# Altium footprint library my Library.PcbLib: 1247 footprints (part 35 of 78)
Each footprint in its own frame and in the unit in brackets; x right, y up, seen from the top. Pads: shape width x height; smd on the part's side, far side on the other; paste and mask are expansions set on the pad; w line width, h text height; cw(c..) or ccw(c..) is an arc to the next point about the centre after c.
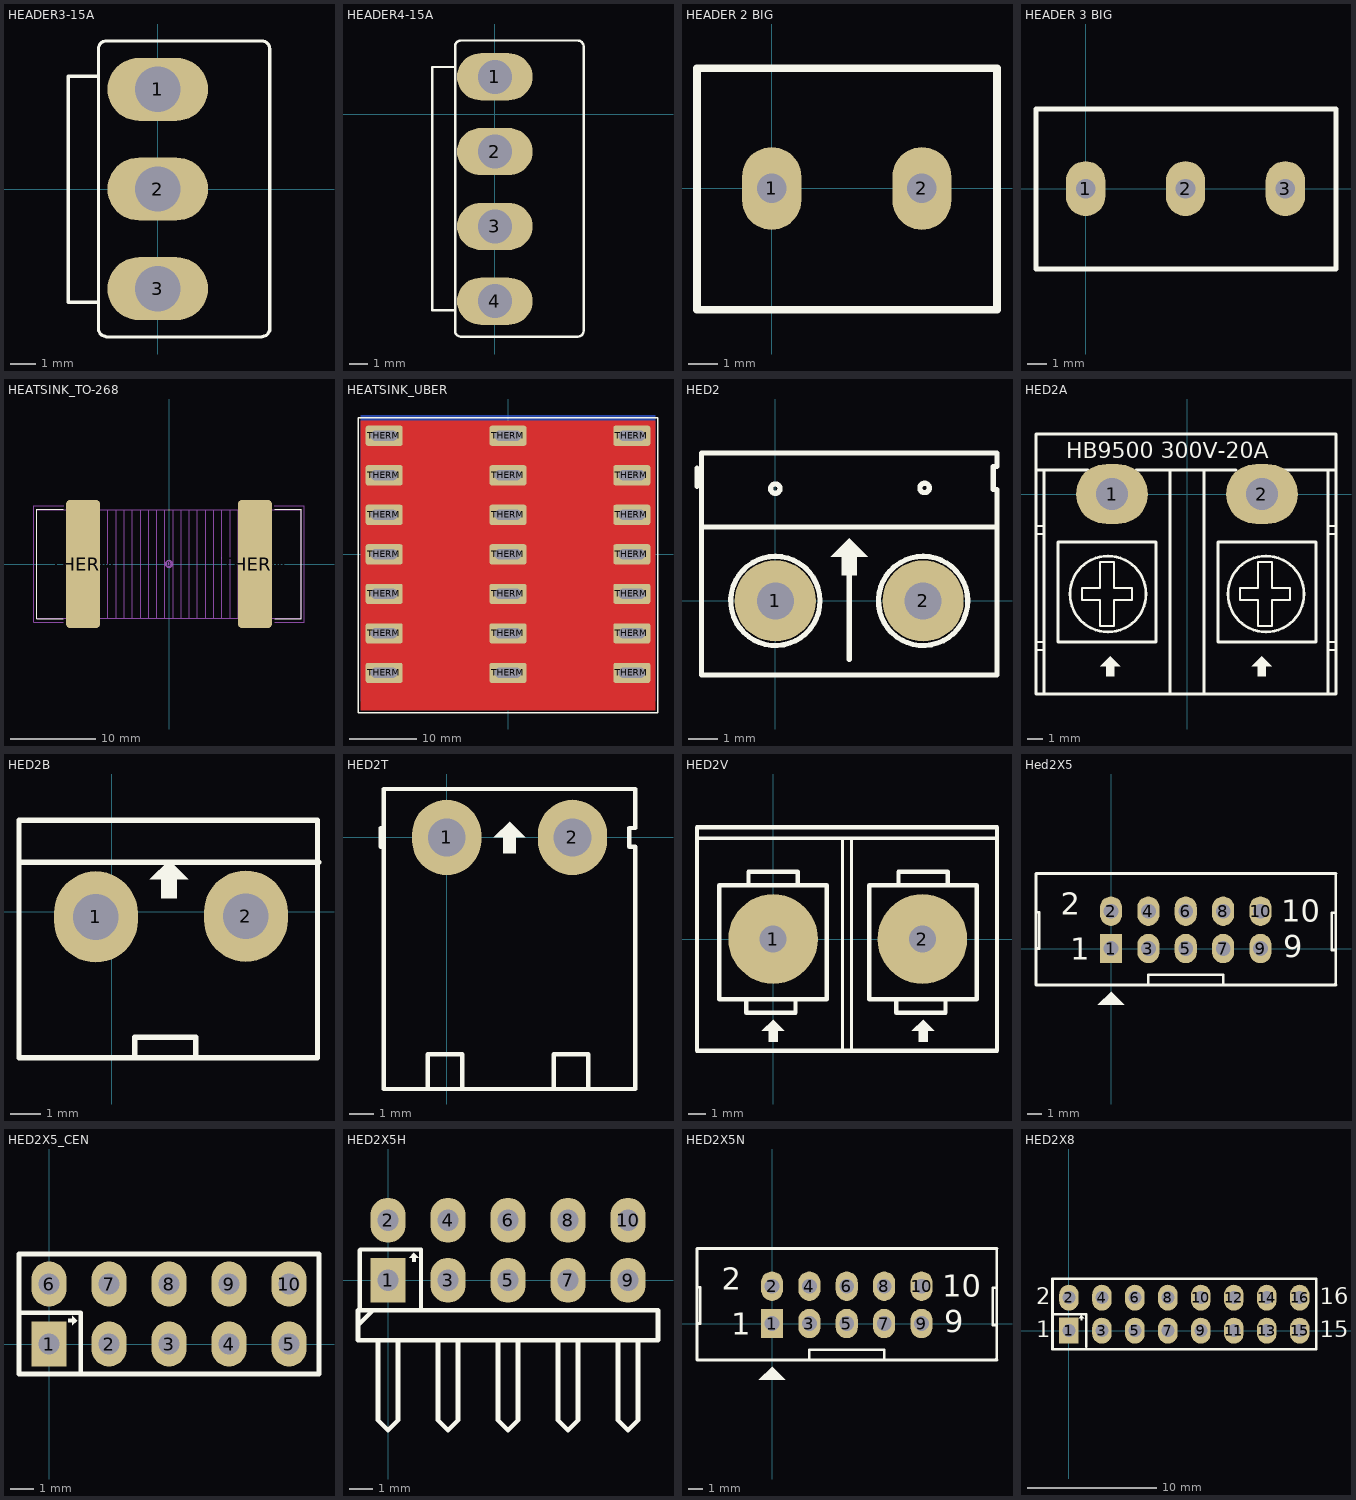
[diagram p34: the footprints below, top view; thin cyan lines are the x and y axes]

## HEADER3-15A [mm]
pads (3):
  oval 4x2.5 hole 1.8: 1(0,3.96) 2(0,0) 3(0,-3.96)
Top Overlay:
  lines w0.127: -2.354,-5.64 -2.354,5.58 cw(c-2.054,5.58) -2.054,5.88 4.146,5.88 cw(c4.146,5.58) 4.446,5.58 4.446,-5.64 ; -2.354,-5.557 ccw(c-2.054,-5.557) -2.054,-5.857 ; -2.354,-4.497 -3.554,-4.497 -3.554,4.48 -2.354,4.48 ; -2.054,-5.88 4.146,-5.88 ; 4.146,-5.857 ccw(c4.146,-5.557) 4.446,-5.557 ; -0.5,-0.52 -0.3,-0.32 ; -0.5,-0.52 -0.5,0.48 ; -0.5,-0.52 0.5,-0.52 ; -0.5,0.48 0.5,0.48 ; -0.5,0.48 -0.3,0.28 ; -0.5,3.48 0.5,3.48 ; -0.5,3.48 -0.3,3.68 ; -0.5,3.48 -0.5,4.48 ; -0.5,4.48 0.5,4.48 ; -0.5,4.48 -0.3,4.28 ; -0.3,-0.32 0.3,-0.32 ; -0.3,-0.32 -0.3,0.28 ; -0.3,0.28 0.3,0.28 ; -0.3,3.68 0.3,3.68 ; -0.3,3.68 -0.3,4.28 ; -0.3,4.28 0.3,4.28 ; 0.3,-0.32 0.3,0.28 ; 0.3,-0.32 0.5,-0.52 ; 0.3,0.28 0.5,0.48 ; 0.3,3.68 0.3,4.28 ; 0.3,3.68 0.5,3.48 ; 0.3,4.28 0.5,4.48 ; 0.5,-0.52 0.5,0.48 ; 0.5,3.48 0.5,4.48
3D body "HEADER2-15A.STEP": height 11.25, standoff -3.55, extent -3.8,-5.932 4.7,1.868
3D body "HEADER2-15A.STEP": height 11.25, standoff -3.55, extent -3.8,-1.995 4.7,5.805

## HEADER4-15A [mm]
pads (4):
  oval 4x2.5 hole 1.8: 1(0,1.98) 2(0,-1.98) 3(0,-5.94) 4(0,-9.9)
Top Overlay:
  lines w0.127: -3.3,-5.461 -3.3,2.5 -2.1,2.5 ; -3.3,-5.374 -3.3,-10.374 -2.1,-10.374 ; -2.1,-4.47 -2.1,3.6 cw(c-1.8,3.6) -1.8,3.9 4.4,3.9 cw(c4.4,3.6) 4.7,3.6 4.7,-3.6 ; -2.1,-4.274 -2.1,-11.474 ccw(c-1.8,-11.474) -1.8,-11.774 4.4,-11.774 ccw(c4.4,-11.474) 4.7,-11.474 4.7,-3.556 ; -0.5,-10.374 -0.3,-10.174 ; -0.5,-10.374 -0.5,-9.374 ; -0.5,-10.374 0.5,-10.374 ; -0.5,-9.374 0.5,-9.374 ; -0.5,-9.374 -0.3,-9.574 ; -0.5,-6.374 0.5,-6.374 ; -0.5,-6.374 -0.3,-6.174 ; -0.5,-6.374 -0.5,-5.374 ; -0.5,-5.374 0.5,-5.374 ; -0.5,-5.374 -0.3,-5.574 ; -0.5,-2.5 0.5,-2.5 ; -0.5,-2.5 -0.5,-1.5 ; -0.5,-2.5 -0.3,-2.3 ; -0.5,-1.5 -0.3,-1.7 ; -0.5,-1.5 0.5,-1.5 ; -0.5,1.5 -0.5,2.5 ; -0.5,1.5 -0.3,1.7 ; -0.5,1.5 0.5,1.5 ; -0.5,2.5 -0.3,2.3 ; -0.5,2.5 0.5,2.5 ; -0.3,-10.174 0.3,-10.174 ; -0.3,-10.174 -0.3,-9.574 ; -0.3,-9.574 0.3,-9.574 ; -0.3,-6.174 0.3,-6.174 ; -0.3,-6.174 -0.3,-5.574 ; -0.3,-5.574 0.3,-5.574 ; -0.3,-2.3 -0.3,-1.7 ; -0.3,-2.3 0.3,-2.3 ; -0.3,-1.7 0.3,-1.7 ; -0.3,1.7 -0.3,2.3 ; -0.3,1.7 0.3,1.7 ; -0.3,2.3 0.3,2.3 ; 0.3,-10.174 0.3,-9.574 ; 0.3,-10.174 0.5,-10.374 ; 0.3,-9.574 0.5,-9.374 ; 0.3,-6.174 0.3,-5.574 ; 0.3,-6.174 0.5,-6.374 ; 0.3,-5.574 0.5,-5.374 ; 0.3,-2.3 0.5,-2.5 ; 0.3,-2.3 0.3,-1.7 ; 0.3,-1.7 0.5,-1.5 ; 0.3,1.7 0.5,1.5 ; 0.3,1.7 0.3,2.3 ; 0.3,2.3 0.5,2.5 ; 0.5,-10.374 0.5,-9.374 ; 0.5,-6.374 0.5,-5.374 ; 0.5,-2.5 0.5,-1.5 ; 0.5,1.5 0.5,2.5
3D body "HEADER2-15A.STEP": height 11.25, standoff -3.55, extent -3.8,-11.774 4.7,-3.974
3D body "HEADER2-15A.STEP": height 11.25, standoff -3.55, extent -3.8,-3.9 4.7,3.9

## HEADER 2 BIG [mm]
pads (2):
  oval 2x2.8 hole 1: 1(0,0) 2(5.08,0)
Top Overlay:
  lines w0.254: -2.527,-4.102 7.62,-4.102 7.62,4.064 -2.527,4.064 -2.527,-4.102

## HEADER 3 BIG [mm]
pads (3):
  oval 2x2.8 hole 1: 1(0,0) 2(5.08,0) 3(10.16,0)
Top Overlay:
  lines w0.254: -2.527,-4.102 12.738,-4.102 12.738,4.064 -2.527,4.064 -2.527,-4.102

## HEATSINK_TO-268 [mm] "SMD heatsink for use with TO-268 / D3-PAK component"
height 10.16
pads (3):
  round 1 on Mech15: 0(0,0)
  rrect25% 4x15 smd: THERM(-10.05,0) THERM(10.05,0)
Top Overlay:
  lines w0.127: -12.4,-6.4 -15.5,-6.4 -15.5,6.4 -12.4,6.4 ; 12.4,-6.4 15.5,-6.4 15.5,6.4 12.4,6.4
Mechanical 13:
  lines w0.05: -10.275,-6.35 -10.275,-6.477 -8.775,-6.477 -8.775,-6.35 ; -10.275,6.35 -10.275,6.477 -8.775,6.477 -8.775,6.35 ; -9.366,-6.35 -9.366,6.35 ; -8.096,-6.35 -8.096,6.35 ; -7.144,-6.35 -7.144,6.35 ; -6.191,-6.35 -6.191,6.35 ; -5.239,-6.35 -5.239,6.35 ; -4.286,-6.35 -4.286,6.35 ; -3.334,-6.35 -3.334,6.35 ; -2.381,-6.35 -2.381,6.35 ; -1.429,-6.35 -1.429,6.35 ; -0.476,-6.35 -0.476,6.35 ; 0.476,-6.35 0.476,6.35 ; 1.429,-6.35 1.429,6.35 ; 2.381,-6.35 2.381,6.35 ; 3.334,-6.35 3.334,6.35 ; 4.286,-6.35 4.286,6.35 ; 5.239,-6.35 5.239,6.35 ; 6.191,-6.35 6.191,6.35 ; 7.144,-6.35 7.144,6.35 ; 8.096,-6.35 8.096,6.35 ; 8.775,-6.35 8.775,-6.477 10.275,-6.477 10.275,-6.35 ; 8.775,6.35 8.775,6.477 10.275,6.477 10.275,6.35 ; 9.366,-6.35 9.366,6.35 ; -15.5,-6.35 -15.5,6.35 15.5,6.35 15.5,-6.35 -15.5,-6.35
Mechanical 15:
  lines w0.127: -12.4,-6.8 -15.8,-6.8 -15.8,6.8 -12.3,6.8 ; 12.3,6.8 15.8,6.8 15.8,-6.8 12.4,-6.8
3D body "Ohmite Style 10 Heatsink.STEP": height 10.16, standoff 0.01, extent -15.5,-6.477 15.5,6.477

## HEATSINK_UBER [mm]
height 60
pads (21):
  rrect20% 5.5x3 hole 1.5 slot 4 at 0 deg: THERM(-18.5,-17.7) THERM(-18.5,-11.8) THERM(-18.5,-5.9) THERM(-18.5,0) THERM(-18.5,5.9) THERM(-18.5,11.8) THERM(-18.5,17.7) THERM(0,-17.7) THERM(0,-11.8) THERM(0,-5.9) THERM(0,0) THERM(0,5.9) THERM(0,11.8) THERM(0,17.7) THERM(18.5,-17.7) THERM(18.5,-11.8) THERM(18.5,-5.9) THERM(18.5,0) THERM(18.5,5.9) THERM(18.5,11.8) THERM(18.5,17.7)
Top Layer:
  rectangle: -22,-23.3 22,20
Bottom Layer:
  region: 22,20.8 -22,20.8 -22,-22 22,-22
Top Overlay:
  lines w0.2: -22.4,-23.7 -22.4,20.4 22.4,20.4 22.4,-23.7 -22.4,-23.7
Mechanical 13:
  lines w0.05: -15.5,-18.395 -3,-18.395 ; -15.5,-18.145 -15.5,-22.443 -3,-22.443 -3,-18.145 ; -15.5,-12.495 -3,-12.495 ; -15.5,-12.245 -15.5,-16.543 -3,-16.543 -3,-12.245 ; -15.5,-6.595 -3,-6.595 ; -15.5,-6.345 -15.5,-10.643 -3,-10.643 -3,-6.345 ; -15.5,-0.694 -3,-0.694 ; -15.5,-0.445 -15.5,-4.743 -3,-4.743 -3,-0.445 ; -15.5,5.206 -3,5.206 ; -15.5,5.456 -15.5,1.157 -3,1.157 -3,5.456 ; -15.5,11.106 -3,11.106 ; -15.5,11.356 -15.5,7.057 -3,7.057 -3,11.356 ; -15.5,17.006 -3,17.006 ; -15.5,17.256 -15.5,12.957 -3,12.957 -3,17.256 ; 3,-18.395 15.5,-18.395 ; 3,-18.145 3,-22.443 15.5,-22.443 15.5,-18.145 ; 3,-12.495 15.5,-12.495 ; 3,-12.245 3,-16.543 15.5,-16.543 15.5,-12.245 ; 3,-6.595 15.5,-6.595 ; 3,-6.345 3,-10.643 15.5,-10.643 15.5,-6.345 ; 3,-0.694 15.5,-0.694 ; 3,-0.445 3,-4.743 15.5,-4.743 15.5,-0.445 ; 3,5.206 15.5,5.206 ; 3,5.456 3,1.157 15.5,1.157 15.5,5.456 ; 3,11.106 15.5,11.106 ; 3,11.356 3,7.057 15.5,7.057 15.5,11.356 ; 3,17.006 15.5,17.006 ; 3,17.256 3,12.957 15.5,12.957 15.5,17.256 ; -20,-18.145 -20,-17.256 20,-17.256 20,-18.145 -20,-18.145 ; -20,-12.245 20,-12.245 20,-11.356 -20,-11.356 -20,-12.245 ; -20,-6.345 20,-6.345 20,-5.456 -20,-5.456 -20,-6.345 ; -20,-0.445 20,-0.445 20,0.445 -20,0.445 -20,-0.445 ; -20,5.456 20,5.456 20,6.345 -20,6.345 -20,5.456 ; -20,11.356 20,11.356 20,12.245 -20,12.245 -20,11.356 ; -20,17.256 20,17.256 20,18.145 -20,18.145 -20,17.256
3D body "heatsink assy.STEP": height 60, standoff -2.48, extent -20,-22.442 20,19.945

## HED2 [mil] "Header 2, 2 pin, hight 300mil, Pin to Pin 200, Colour Green"
height 300
pads (2):
  round 110 hole 50: 1(0,0) 2(200,0)
Top Overlay:
  circle w7: c202,153 r6.4
  circle w7: c0,152 r6.4
  region: 100,85 75,60 90,60 90,35 110,35 110,60 125,60
  lines w7: -106,155 -106,180 ; -98,100 299,100 ; 38.83,46.23 ccw(c0,0) 40.11,45.12 ; 100,-79 100,72 ; 238.74,46.3 ccw(c200,0) 240.11,45.12 ; -100,-100 -100,50 -100,200 300,200 300,182 295,182 295,151 300,151 300,-100 -100,-100
3D body "SW3dPS-KRM2.STEP": height 393.7, standoff -157.48, extent -91.85,-90 301.85,205.28

## HED2A [mil] "Header 2: 300V-20A, 2 pin, hight 300mil, Pin to Pin 400, Colour Green"
height 300
pads (2):
  oval 180x150 hole 80: 1(-187.5,0) 2(187.5,0)
Top Overlay:
  circle w7: c197.5,-250 r95
  circle w7: c-197.5,-250 r95
  region: 187.5,-405 162.5,-430 177.5,-430 177.5,-455 197.5,-455 197.5,-430 212.5,-430
  region: -192.5,-405 -217.5,-430 -202.5,-430 -202.5,-455 -182.5,-455 -182.5,-430 -167.5,-430
  lines w5: -375,-390 -360,-390 ; -375,-370 -360,-370 ; -375,-100 -360,-100 ; -375,-80 -360,-80 ; 355,-390 370,-390 ; 355,-370 370,-370 ; 355,-100 370,-100 ; 355,-80 370,-80 ; -262.5,-265 -217.5,-265 -217.5,-330 -182.5,-330 -182.5,-265 -137.5,-265 -137.5,-235 -182.5,-235 -182.5,-170 -217.5,-170 -217.5,-235 -262.5,-235 -262.5,-265 ; 132.5,-265 132.5,-235 177.5,-235 177.5,-170 212.5,-170 212.5,-235 257.5,-235 257.5,-265 212.5,-265 212.5,-330 177.5,-330 177.5,-265 132.5,-265
  lines w7: -377.5,60 -247.5,60 ; -357.5,-495 -357.5,60 ; -127.5,60 122.5,60 ; -42.5,-495 -42.5,60 ; 42.5,-495 42.5,60 ; 242.5,60 372.5,60 ; 352.5,-495 352.5,60 ; -377.5,-500 372.5,-500 372.5,150 -377.5,150 -377.5,-500 ; -322.5,-370 -322.5,-120 -77.5,-120 -77.5,-370 -322.5,-370 ; 77.5,-370 322.5,-370 322.5,-120 77.5,-120 77.5,-370
  text "HB9500 300V-20A" at -302.5,90 h40
3D body "User Library-TB2.STEP": height 31.5, standoff -500, extent -215.85,-182 177.85,132.96

## HED2B [mil] "Header 2, 2 pin, hight 300mil, Pin to Pin 150, Colour White"
height 300
pads (2):
  oval 110x120 hole 60: 1(-21,-7) 2(176,-6)
Top Overlay:
  region: 75,67.5 50,42.5 65,42.5 65,17.5 85,17.5 85,42.5 100,42.5
  lines w7: -119,65 272,65 ; 30,-188 30,-165 110,-165 110,-190 ; -122,-192 -122,120 270,120 270,-192 -122,-192
3D body "User Library-TB2.STEP": height 31.5, standoff -500, extent -123.85,-189 269.85,125.96

## HED2T [mil] "Header 2, 2 pin, hight 300mil, Pin to Pin 200, Colour Green"
height 300
pads (2):
  oval 110x120 hole 60: 1(0,0) 2(200,0)
Top Overlay:
  region: 100,25 75,0 90,0 90,-25 110,-25 110,0 125,0
  lines w7: -105,-15 -105,15 ; -30,-400 -30,-345 25,-345 25,-400 ; 170,-400 170,-345 225,-345 225,-400 ; -100,-400 300,-400 300,-15 290,-15 290,15 300,15 300,77 -100,77 -100,-400
3D body "SW3dPS-5EHDR_2P.STEP": height 333.51, standoff -157.48, extent -98,-400.22 295.7,72.22

## HED2V [mil] "Header 6"
height 300
pads (2):
  round 200 hole 60: 1(0,0) 2(333.33,0)
Top Overlay:
  region: 0,-180 -25,-205 -10,-205 -10,-230 10,-230 10,-205 25,-205
  region: 335,-180 310,-205 325,-205 325,-230 345,-230 345,-205 360,-205
  lines w7: -170,225 499,225 ; 155,-250 155,225 ; 175,-250 175,225
  lines w10: -60,-135 -60,-165 50,-165 50,-135 ; -55,120 -55,150 55,150 55,120 ; 275,-135 275,-165 385,-165 385,-135 ; 280,120 280,150 390,150 390,120 ; -170,-250 500,-250 500,250 -170,250 -170,-250 ; -120,-135 -120,120 120,120 120,-135 -120,-135 ; 215,-135 455,-135 455,120 215,120 215,-135

## Hed2X5 [mm] "Header 10x2,20 pin, connecter"
height 7.62
pads (10):
  rect 1.5x2 hole 1: 1(0,0)
  oval 1.5x2 hole 1: 2(0,2.54) 3(2.54,0) 4(2.54,2.54) 5(5.08,0) 6(5.08,2.54) 7(7.62,0) 8(7.62,2.54) 9(10.16,0) 10(10.16,2.54)
Top Overlay:
  region: 0,-2.921 -0.889,-3.81 0.889,-3.81
  lines w0.178: -5.1,-0.025 -5.075,0 -4.875,0 -4.875,2.475 -5.1,2.475 ; 2.525,-2.438 2.525,-1.778 7.625,-1.778 7.625,-2.464 ; 15.203,-2.45 15.265,-2.388 ; 15.265,-0.102 15.011,-0.102 15.011,2.423 15.265,2.423 ; 15.291,-2.475 -5.1,-2.475 -5.1,5.1 ; -5.1,5.1 15.291,5.1 -5.1,5.1 ; 15.265,-2.388 15.265,5.105 15.265,-2.388
  text "1" at -2.775,-0.75 h1.52
  text "2" at -3.429,2.286 h1.52
  text "9" at 11.709,-0.61 h1.52
  text "10" at 11.582,1.803 h1.52
3D body "BH-10 vuong.step": height 8.82, standoff -3.28, extent -5.17,-3.331 15.33,5.969

## HED2X5_CEN [mm] "Connector; Header; 5x2 Position"
pads (10):
  rect 1.5x1.9 hole 0.9: 1(0,0)
  oval 1.5x1.9 hole 0.9: 2(2.54,0) 3(5.08,0) 4(7.62,0) 5(10.16,0) 6(0,2.54) 7(2.54,2.54) 8(5.08,2.54) 9(7.62,2.54) 10(10.16,2.54)
Top Overlay:
  region: 0.813,1.067 0.991,1.067 0.991,1.194 1.194,0.991 0.991,0.787 0.991,0.914 0.813,0.914
  lines w0.178: -1.219,1.321 1.346,1.321 1.346,1.194 1.346,-1.194
  lines w0.2: -1.27,-1.27 -1.27,3.81 11.43,3.81 11.43,-1.27 -1.27,-1.27
3D body "pin_header_awl254-da-g10d.stp": height 5.02, standoff -2.98, extent -1.245,-10.024 11.455,2.856

## HED2X5H [mm] "Connector; Header; 5x2 Position; Right Angle"
pads (10):
  rect 1.5x1.9 hole 0.9: 1(0,0)
  oval 1.5x1.9 hole 0.9: 2(0,2.54) 3(2.54,0) 4(2.54,2.54) 5(5.08,0) 6(5.08,2.54) 7(7.62,0) 8(7.62,2.54) 9(10.16,0) 10(10.16,2.54)
Top Overlay:
  region: 1.016,0.775 1.016,0.953 0.889,0.953 1.092,1.156 1.295,0.953 1.168,0.953 1.168,0.775
  lines w0.178: -1.194,-1.295 -1.194,1.27 ; -1.168,1.295 1.397,1.295 1.397,1.168 1.397,-1.219
  lines w0.2: -1.27,-1.905 -0.635,-1.27 ; -0.423,-2.54 -0.423,-5.927 0,-6.35 0.423,-5.927 0.423,-2.54 ; 2.117,-2.54 2.117,-5.927 2.54,-6.35 2.963,-5.927 2.963,-2.54 ; 4.657,-2.54 4.657,-5.927 5.08,-6.35 5.503,-5.927 5.503,-2.54 ; 7.197,-2.54 7.197,-5.927 7.62,-6.35 8.043,-5.927 8.043,-2.54 ; 9.737,-2.54 9.737,-5.927 10.16,-6.35 10.583,-5.927 10.583,-2.54 ; -1.27,-2.54 11.43,-2.54 11.43,-1.27 -1.27,-1.27 -1.27,-2.54

## HED2X5N [mm] "Connector; Header; 5x2 Position"
pads (10):
  rect 1.5x2 hole 1: 1(0,0)
  oval 1.5x2 hole 1: 2(0,2.54) 3(2.54,0) 4(2.54,2.54) 5(5.08,0) 6(5.08,2.54) 7(7.62,0) 8(7.62,2.54) 9(10.16,0) 10(10.16,2.54)
Top Overlay:
  region: 0,-2.921 -0.889,-3.81 0.889,-3.81
  lines w0.178: -5.1,-0.025 -5.075,0 -4.875,0 -4.875,2.475 -5.1,2.475 ; 2.525,-2.438 2.525,-1.778 7.625,-1.778 7.625,-2.464 ; 15.203,-2.45 15.265,-2.388 ; 15.265,-0.102 15.011,-0.102 15.011,2.423 15.265,2.423 ; 15.291,-2.475 -5.1,-2.475 -5.1,5.1 ; -5.1,5.1 15.291,5.1 -5.1,5.1 ; 15.265,-2.388 15.265,5.105 15.265,-2.388
  text "1" at -2.775,-0.75 h1.52
  text "2" at -3.429,2.286 h1.52
  text "9" at 11.709,-0.61 h1.52
  text "10" at 11.582,1.803 h1.52
3D body "User Library-HDB-10.step": height 8.8, standoff -3, extent -5.071,-3.708 15.129,5.692

## HED2X8 [mm] "Connector; Header; 8x2 Position"
pads (16):
  rect 1.5x2 hole 1: 1(0,0)
  oval 1.5x2 hole 1: 2(0,2.54) 3(2.54,0) 4(2.54,2.54) 5(5.08,0) 6(5.08,2.54) 7(7.62,0) 8(7.62,2.54) 9(10.16,0) 10(10.16,2.54) 11(12.7,0) 12(12.7,2.54) 13(15.24,0) 14(15.24,2.54) 15(17.78,0) 16(17.78,2.54)
Top Overlay:
  region: 0.889,0.787 0.889,0.965 0.762,0.965 0.965,1.168 1.168,0.965 1.041,0.965 1.041,0.787
  lines w0.178: -1.219,1.295 -1.194,1.27 1.321,1.27 1.321,-1.245
  lines w0.2: -1.27,-1.422 19.05,-1.422 19.05,3.988 -1.27,3.988 -1.27,-1.422
  text "16" at 19.304,2.032 h1.27
  text "15" at 19.304,-0.508 h1.27
  text "1" at -2.54,-0.508 h1.27
  text "2" at -2.54,2.032 h1.27